# Altium footprint library CADTcommon.PcbLib: 503 footprints (part 31 of 32)
Each footprint in its own frame and in the unit in brackets; x right, y up, seen from the top. Pads: shape width x height; smd on the part's side, far side on the other; paste and mask are expansions set on the pad; w line width, h text height; cw(c..) or ccw(c..) is an arc to the next point about the centre after c.
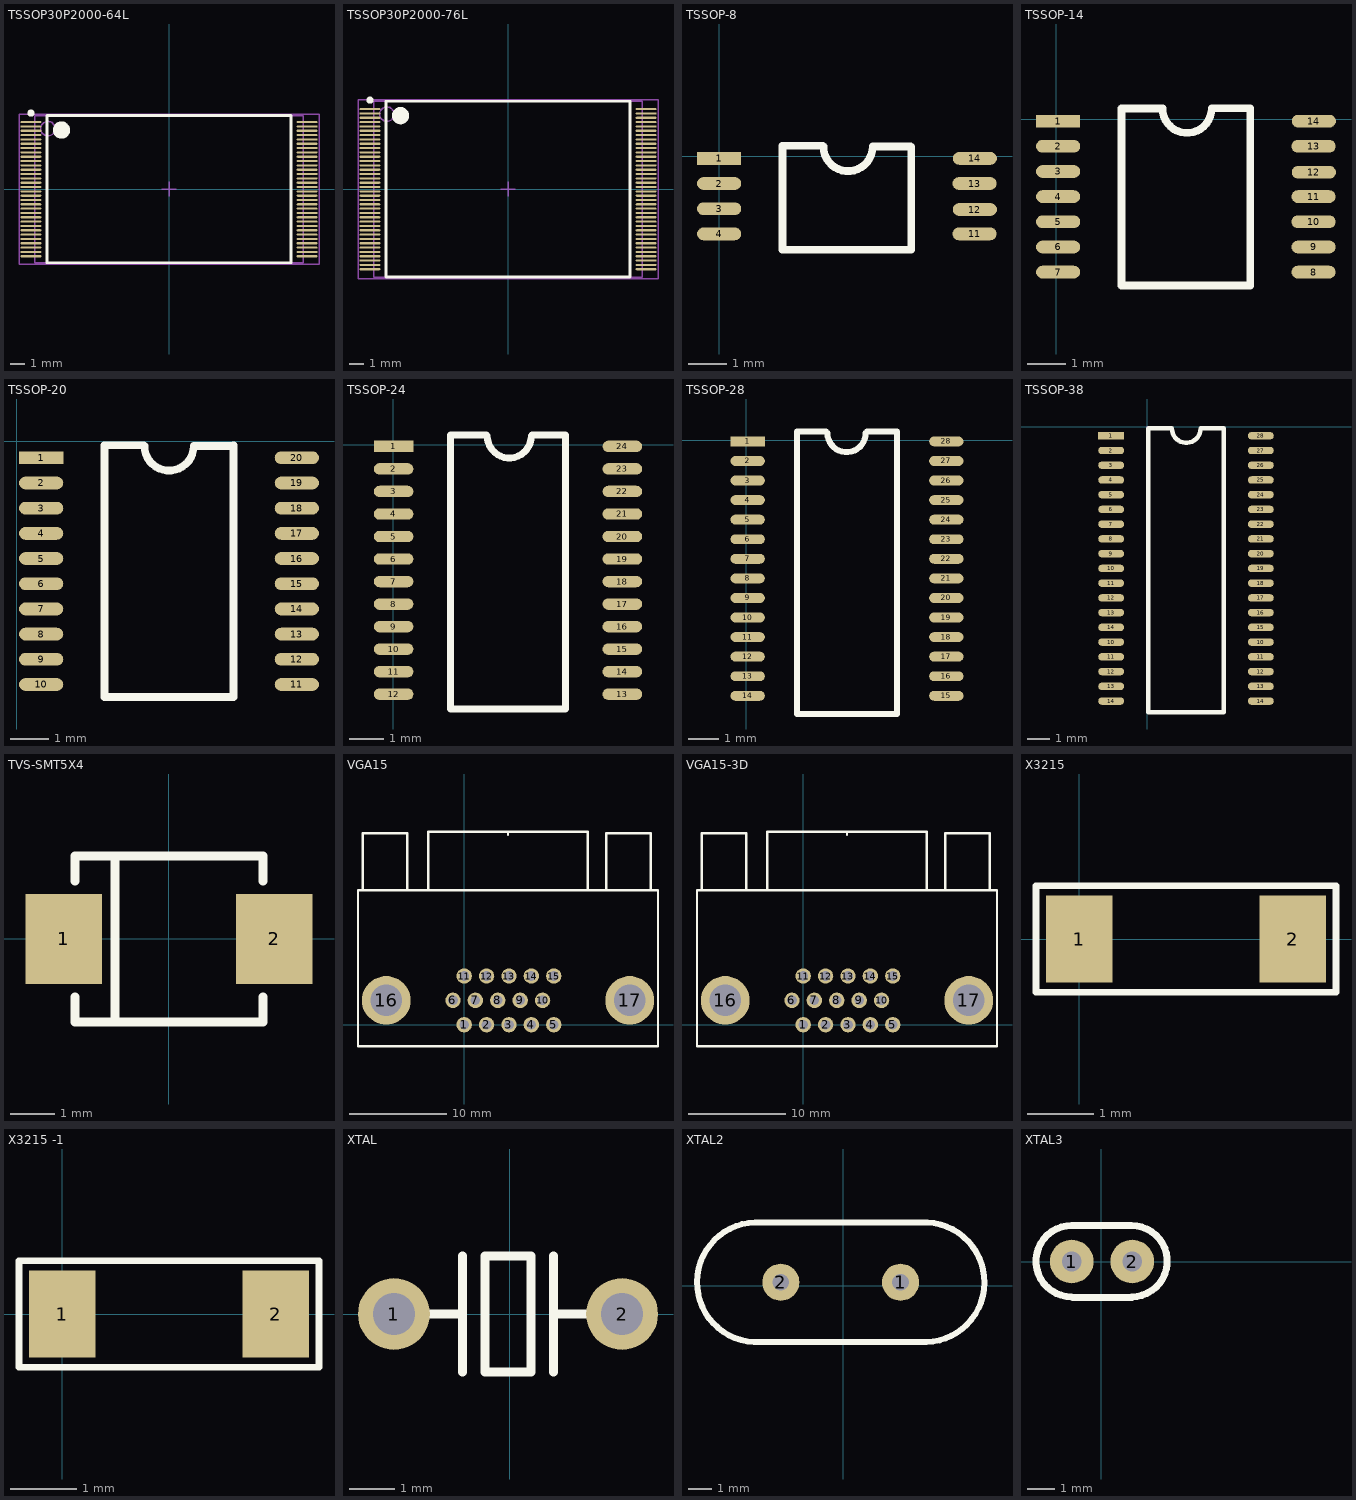
[diagram p30: the footprints below, top view; thin cyan lines are the x and y axes]

## TSSOP30P2000-64L [mm] "TSSOP, 64-Leads, Body 10.2x18.6mm; Pitch 0.3mm, IPC High Density"
height 1.27
pads (64):
  oval 1.45x0.15 smd: 1(-9.575,4.65) 2(-9.575,4.35) 3(-9.575,4.05) 4(-9.575,3.75) 5(-9.575,3.45) 6(-9.575,3.15) 7(-9.575,2.85) 8(-9.575,2.55) 9(-9.575,2.25) 10(-9.575,1.95) 11(-9.575,1.65) 12(-9.575,1.35) 13(-9.575,1.05) 14(-9.575,0.75) 15(-9.575,0.45) 16(-9.575,0.15) 17(-9.575,-0.15) 18(-9.575,-0.45) 19(-9.575,-0.75) 20(-9.575,-1.05) 21(-9.575,-1.35) 22(-9.575,-1.65) 23(-9.575,-1.95) 24(-9.575,-2.25) 25(-9.575,-2.55) 26(-9.575,-2.85) 27(-9.575,-3.15) 28(-9.575,-3.45) 29(-9.575,-3.75) 30(-9.575,-4.05) 31(-9.575,-4.35) 32(-9.575,-4.65) 33(9.575,-4.65) 34(9.575,-4.35) 35(9.575,-4.05) 36(9.575,-3.75) 37(9.575,-3.45) 38(9.575,-3.15) 39(9.575,-2.85) 40(9.575,-2.55) 41(9.575,-2.25) 42(9.575,-1.95) 43(9.575,-1.65) 44(9.575,-1.35) 45(9.575,-1.05) 46(9.575,-0.75) 47(9.575,-0.45) 48(9.575,-0.15) 49(9.575,0.15) 50(9.575,0.45) 51(9.575,0.75) 52(9.575,1.05) 53(9.575,1.35) 54(9.575,1.65) 55(9.575,1.95) 56(9.575,2.25) 57(9.575,2.55) 58(9.575,2.85) 59(9.575,3.15) 60(9.575,3.45) 61(9.575,3.75) 62(9.575,4.05) 63(9.575,4.35) 64(9.575,4.65)
Top Overlay:
  circle w0.25: c-9.575,5.275 r0.125
  circle w0.6: c-7.45,4.1 r0.3
  lines w0.2: -8.45,-5.1 -8.45,5.1 8.45,5.1 8.45,-5.1 -8.45,-5.1
Mechanical 13:
  circle w0.1: c-8.4,4.2 r0.5
  lines w0.1: -9.3,-5.1 -9.3,5.1 9.3,5.1 9.3,-5.1 -9.3,-5.1
Mechanical 15:
  lines w0.1: -0.5,0 0.5,0 ; 0,-0.5 0,0.5 ; -10.4,-5.2 -10.4,5.2 10.4,5.2 10.4,-5.2 -10.4,-5.2
3D body: height 1.27, standoff 0, extent -9.3,-5.1 9.3,5.1

## TSSOP30P2000-76L [mm] "TSSOP, 76-Leads, Body 12.2x18.6mm; Pitch 0.3mm, IPC High Density"
height 1.27
pads (76):
  oval 1.45x0.15 smd: 1(-9.575,5.55) 2(-9.575,5.25) 3(-9.575,4.95) 4(-9.575,4.65) 5(-9.575,4.35) 6(-9.575,4.05) 7(-9.575,3.75) 8(-9.575,3.45) 9(-9.575,3.15) 10(-9.575,2.85) 11(-9.575,2.55) 12(-9.575,2.25) 13(-9.575,1.95) 14(-9.575,1.65) 15(-9.575,1.35) 16(-9.575,1.05) 17(-9.575,0.75) 18(-9.575,0.45) 19(-9.575,0.15) 20(-9.575,-0.15) 21(-9.575,-0.45) 22(-9.575,-0.75) 23(-9.575,-1.05) 24(-9.575,-1.35) 25(-9.575,-1.65) 26(-9.575,-1.95) 27(-9.575,-2.25) 28(-9.575,-2.55) 29(-9.575,-2.85) 30(-9.575,-3.15) 31(-9.575,-3.45) 32(-9.575,-3.75) 33(-9.575,-4.05) 34(-9.575,-4.35) 35(-9.575,-4.65) 36(-9.575,-4.95) 37(-9.575,-5.25) 38(-9.575,-5.55) 39(9.575,-5.55) 40(9.575,-5.25) 41(9.575,-4.95) 42(9.575,-4.65) 43(9.575,-4.35) 44(9.575,-4.05) 45(9.575,-3.75) 46(9.575,-3.45) 47(9.575,-3.15) 48(9.575,-2.85) 49(9.575,-2.55) 50(9.575,-2.25) 51(9.575,-1.95) 52(9.575,-1.65) 53(9.575,-1.35) 54(9.575,-1.05) 55(9.575,-0.75) 56(9.575,-0.45) 57(9.575,-0.15) 58(9.575,0.15) 59(9.575,0.45) 60(9.575,0.75) 61(9.575,1.05) 62(9.575,1.35) 63(9.575,1.65) 64(9.575,1.95) 65(9.575,2.25) 66(9.575,2.55) 67(9.575,2.85) 68(9.575,3.15) 69(9.575,3.45) 70(9.575,3.75) 71(9.575,4.05) 72(9.575,4.35) 73(9.575,4.65) 74(9.575,4.95) 75(9.575,5.25) 76(9.575,5.55)
Top Overlay:
  circle w0.25: c-9.575,6.175 r0.125
  circle w0.6: c-7.45,5.1 r0.3
  lines w0.2: -8.45,-6.1 -8.45,6.1 8.45,6.1 8.45,-6.1 -8.45,-6.1
Mechanical 13:
  circle w0.1: c-8.4,5.2 r0.5
  lines w0.1: -9.3,-6.1 -9.3,6.1 9.3,6.1 9.3,-6.1 -9.3,-6.1
Mechanical 15:
  lines w0.1: -0.5,0 0.5,0 ; 0,-0.5 0,0.5 ; -10.4,-6.2 -10.4,6.2 10.4,6.2 10.4,-6.2 -10.4,-6.2
3D body: height 1.27, standoff 0, extent -9.3,-6.1 9.3,6.1

## TSSOP-8 [mil]
pads (8):
  rect 45x12.99 smd: 1(-0.16,-2)
  oval 45x12.99 smd: 2(-0.16,-27.59) 3(-0.16,-53.18) 4(-0.16,-78.77) 11(259.69,-78.77) 12(260,-54) 13(259.69,-27.59) 14(260,-2)
Top Overlay:
  lines w7.87: 105.2,10.79 64.21,10.79 64.21,-94.88 195.31,-94.88 195.31,9.84 ; 106,10 ccw(c131,10) 156,10 194.52,10

## TSSOP-14 [mil]
pads (14):
  rect 45x12.99 smd: 1(1.84,-2)
  oval 45x12.99 smd: 2(1.84,-27.59) 3(1.84,-53.18) 4(1.84,-78.77) 5(1.84,-104.36) 6(1.84,-129.95) 7(1.84,-155.54) 8(261.69,-155.54) 9(261.69,-129.95) 10(261.69,-104.36) 11(261.69,-78.77) 12(262,-54) 13(261.69,-27.59) 14(262,-2)
Top Overlay:
  lines w7.87: 107.64,10.79 66.21,10.79 66.21,-169.29 197.31,-169.29 197.31,10.79 ; 108,11 ccw(c133,11) 158,11 197.11,11

## TSSOP-20 [mm]
pads (20):
  rect 1.143x0.33 smd: 1(0.635,-0.432)
  oval 1.143x0.33 smd: 2(0.635,-1.082) 3(0.635,-1.732) 4(0.635,-2.382) 5(0.635,-3.032) 6(0.635,-3.682) 7(0.635,-4.332) 8(0.635,-4.982) 9(0.635,-5.632) 10(0.635,-6.282) 11(7.235,-6.282) 12(7.235,-5.632) 13(7.235,-4.982) 14(7.235,-4.332) 15(7.235,-3.682) 16(7.235,-3.032) 17(7.235,-2.382) 18(7.235,-1.732) 19(7.235,-1.082) 20(7.235,-0.432)
Top Overlay:
  lines w0.2: 3.282,-0.107 2.27,-0.107 2.27,-6.607 5.6,-6.607 5.6,-0.107 ; 3.302,-0.127 ccw(c3.937,-0.127) 4.572,-0.127 5.58,-0.127

## TSSOP-24 [mm]
pads (24):
  rect 1.143x0.33 smd: 1(0.016,-0.046)
  oval 1.143x0.33 smd: 2(0.016,-0.696) 3(0.016,-1.346) 4(0.016,-1.996) 5(0.016,-2.646) 6(0.016,-3.296) 7(0.016,-3.946) 8(0.016,-4.596) 9(0.016,-5.246) 10(0.016,-5.896) 11(0.016,-6.546) 12(0.016,-7.196) 13(6.616,-7.196) 14(6.616,-6.546) 15(6.616,-5.896) 16(6.616,-5.246) 17(6.616,-4.596) 18(6.616,-3.946) 19(6.616,-3.296) 20(6.616,-2.646) 21(6.616,-1.996) 22(6.616,-1.346) 23(6.616,-0.696) 24(6.616,-0.046)
Top Overlay:
  lines w0.2: 2.692,0.279 1.651,0.279 1.651,-7.62 4.981,-7.62 4.981,0.279 4.013,0.279 ; 2.718,0.254 ccw(c3.353,0.254) 3.988,0.254

## TSSOP-28 [mm]
pads (28):
  rect 1.143x0.33 smd: 1(0.041,-0.046)
  oval 1.143x0.33 smd: 2(0.041,-0.696) 3(0.041,-1.346) 4(0.041,-1.996) 5(0.041,-2.646) 6(0.041,-3.296) 7(0.041,-3.946) 8(0.041,-4.596) 9(0.041,-5.246) 10(0.041,-5.896) 11(0.041,-6.546) 12(0.041,-7.196) 13(0.041,-7.846) 14(0.041,-8.496) 15(6.641,-8.496) 16(6.641,-7.846) 17(6.641,-7.196) 18(6.641,-6.546) 19(6.641,-5.896) 20(6.641,-5.246) 21(6.641,-4.596) 22(6.641,-3.946) 23(6.641,-3.296) 24(6.641,-2.646) 25(6.641,-1.996) 26(6.641,-1.346) 27(6.641,-0.696) 28(6.641,-0.046)
Top Overlay:
  lines w0.2: 2.642,0.279 1.676,0.279 1.676,-9.1 5.006,-9.1 5.006,0.279 4.013,0.279 ; 2.692,0.229 ccw(c3.327,0.229) 3.962,0.229

## TSSOP-38 [mm]
pads (38):
  rect 1.143x0.33 smd: 1(-1.584,-0.401)
  oval 1.143x0.33 smd: 2(-1.584,-1.051) 3(-1.584,-1.701) 4(-1.584,-2.351) 5(-1.584,-3.001) 6(-1.584,-3.651) 7(-1.584,-4.301) 8(-1.584,-4.951) 9(-1.584,-5.601) 10(-1.584,-9.501) 10(-1.584,-6.251) 10(5.016,-9.501) 11(-1.584,-10.151) 11(-1.584,-6.901) 11(5.016,-10.151) 12(-1.584,-10.801) 12(-1.584,-7.551) 12(5.016,-10.801) 13(-1.584,-11.451) 13(-1.584,-8.201) 13(5.016,-11.451) 14(-1.584,-12.101) 14(-1.584,-8.851) 14(5.016,-12.101) 15(5.016,-8.851) 16(5.016,-8.201) 17(5.016,-7.551) 18(5.016,-6.901) 19(5.016,-6.251) 20(5.016,-5.601) 21(5.016,-4.951) 22(5.016,-4.301) 23(5.016,-3.651) 24(5.016,-3.001) 25(5.016,-2.351) 26(5.016,-1.701) 27(5.016,-1.051) 28(5.016,-0.401)
Top Overlay:
  lines w0.2: 0.051,-12.6 0.051,-0.076 1.092,-0.076 ccw(c1.727,-0.076) 2.362,-0.076 3.381,-0.076 3.381,-12.6 0.051,-12.6

## TVS-SMT5X4 [mm] "钽电容"
height 1.1
pads (2):
  rect 1.7x2 smd: 1(-2.35,0) 2(2.35,0)
Top Overlay:
  lines w0.2: -2.1,-1.295 -2.1,-1.85 2.1,-1.85 2.1,-1.295 ; -2.1,1.295 -2.1,1.85 2.1,1.85 2.1,1.295 ; -1.211,-1.85 -1.211,1.85
3D body: height 2.5, standoff 0, extent -2.775,-1.97 2.825,1.93

## VGA15 [mm]
pads (17):
  round 1.58 hole 1: 1(0,0) 2(2.3,0) 3(4.6,0) 4(6.9,0) 5(9.2,0) 6(-1.15,2.5) 7(1.15,2.5) 8(3.45,2.5) 9(5.75,2.5) 10(8.05,2.5) 11(0,5) 12(2.3,5) 13(4.6,5) 14(6.9,5) 15(9.2,5)
  round 5 hole 3.25: 16(-8,2.5) 17(17,2.5)
Top Overlay:
  lines w0.254: -10.9,-2.2 -10.9,13.8 19.9,13.8 19.9,-2.2 -10.89,-2.2 -10.9,-2.19 ; -10.4,13.8 -10.4,19.67 -5.83,19.67 -5.83,13.82 ; -3.7,13.8 -3.7,19.8 12.7,19.8 12.7,13.8 ; 4.5,19.5 4.5,19.8 ; 14.6,13.8 14.6,19.68 19.18,19.68 19.18,13.84
3D body: height 12.77, standoff -3.27, extent -11.055,-0.875 19.755,20.225

## VGA15-3D [mm]
pads (17):
  round 1.58 hole 1: 1(0,0) 2(2.3,0) 3(4.6,0) 4(6.9,0) 5(9.2,0) 6(-1.15,2.5) 7(1.15,2.5) 8(3.45,2.5) 9(5.75,2.5) 10(8.05,2.5) 11(0,5) 12(2.3,5) 13(4.6,5) 14(6.9,5) 15(9.2,5)
  round 5 hole 3.25: 16(-8,2.5) 17(17,2.5)
Top Overlay:
  lines w0.254: -10.9,-2.2 -10.9,13.8 19.9,13.8 19.9,-2.2 -10.89,-2.2 -10.9,-2.19 ; -10.4,13.8 -10.4,19.67 -5.83,19.67 -5.83,13.82 ; -3.7,13.8 -3.7,19.8 12.7,19.8 12.7,13.8 ; 4.5,19.5 4.5,19.8 ; 14.6,13.8 14.6,19.68 19.18,19.68 19.18,13.84
3D body: height 12.77, standoff -3.27, extent -11.055,-0.875 19.755,20.225

## X3215 [mm]
pads (2):
  rect 1x1.3 smd: 1(0,0) 2(3.2,0)
Top Overlay:
  lines w0.1: -0.65,-0.8 3.85,-0.8 3.85,0.8 -0.65,0.8 -0.65,-0.8
3D body: height 0.81, standoff 0, extent 0,-0.762 3.2,0.738

## X3215 -1 [mm]
pads (2):
  rect 1x1.3 smd: 1(0,0) 2(3.2,0)
Top Overlay:
  lines w0.1: -0.65,-0.8 3.85,-0.8 3.85,0.8 -0.65,0.8 -0.65,-0.8
3D body: height 0.81, standoff 0, extent 0.026,-0.787 3.226,0.713

## XTAL [mil]
pads (2):
  round 62 hole 36: 1(-100,0) 2(96.85,0)
Top Overlay:
  lines w7.87: -93.7,0 -43.7,0 ; -40.95,-50 -40.95,50 ; 37.8,-50 37.8,50 ; 40.55,0 90.55,0 ; -21.26,-50 -21.26,50 18.11,50 18.11,-50 -21.26,-50

## XTAL2 [mil]
pads (2):
  round 62 hole 28: 1(96,6) 2(-104,6)
Top Overlay:
  lines w10: -136.03,105.68 ccw(c-144,6) -137.56,-93.79 -137.45,-93.68 128.03,-93.68 ; 128.03,-93.68 ccw(c136,6) 129.56,105.79 -135.91,105.79 ; -135.91,105.79 -136.03,105.68 -135.91,105.79

## XTAL3 [mil]
pads (2):
  round 62 hole 28: 1(-41.85,0) 2(44,0)
Top Overlay:
  lines w10: 43.11,-50.11 ccw(c43.11,0.49) 43.11,51.1 -42,51.1 ccw(c-42,0.55) -42,-50 -41,-51 44,-51